# Altium footprint library 定位手表.PcbLib: 35 footprints (part 1 of 3)
Each footprint in its own frame and in the unit in brackets; x right, y up, seen from the top. Pads: shape width x height; smd on the part's side, far side on the other; paste and mask are expansions set on the pad; w line width, h text height; cw(c..) or ccw(c..) is an arc to the next point about the centre after c.
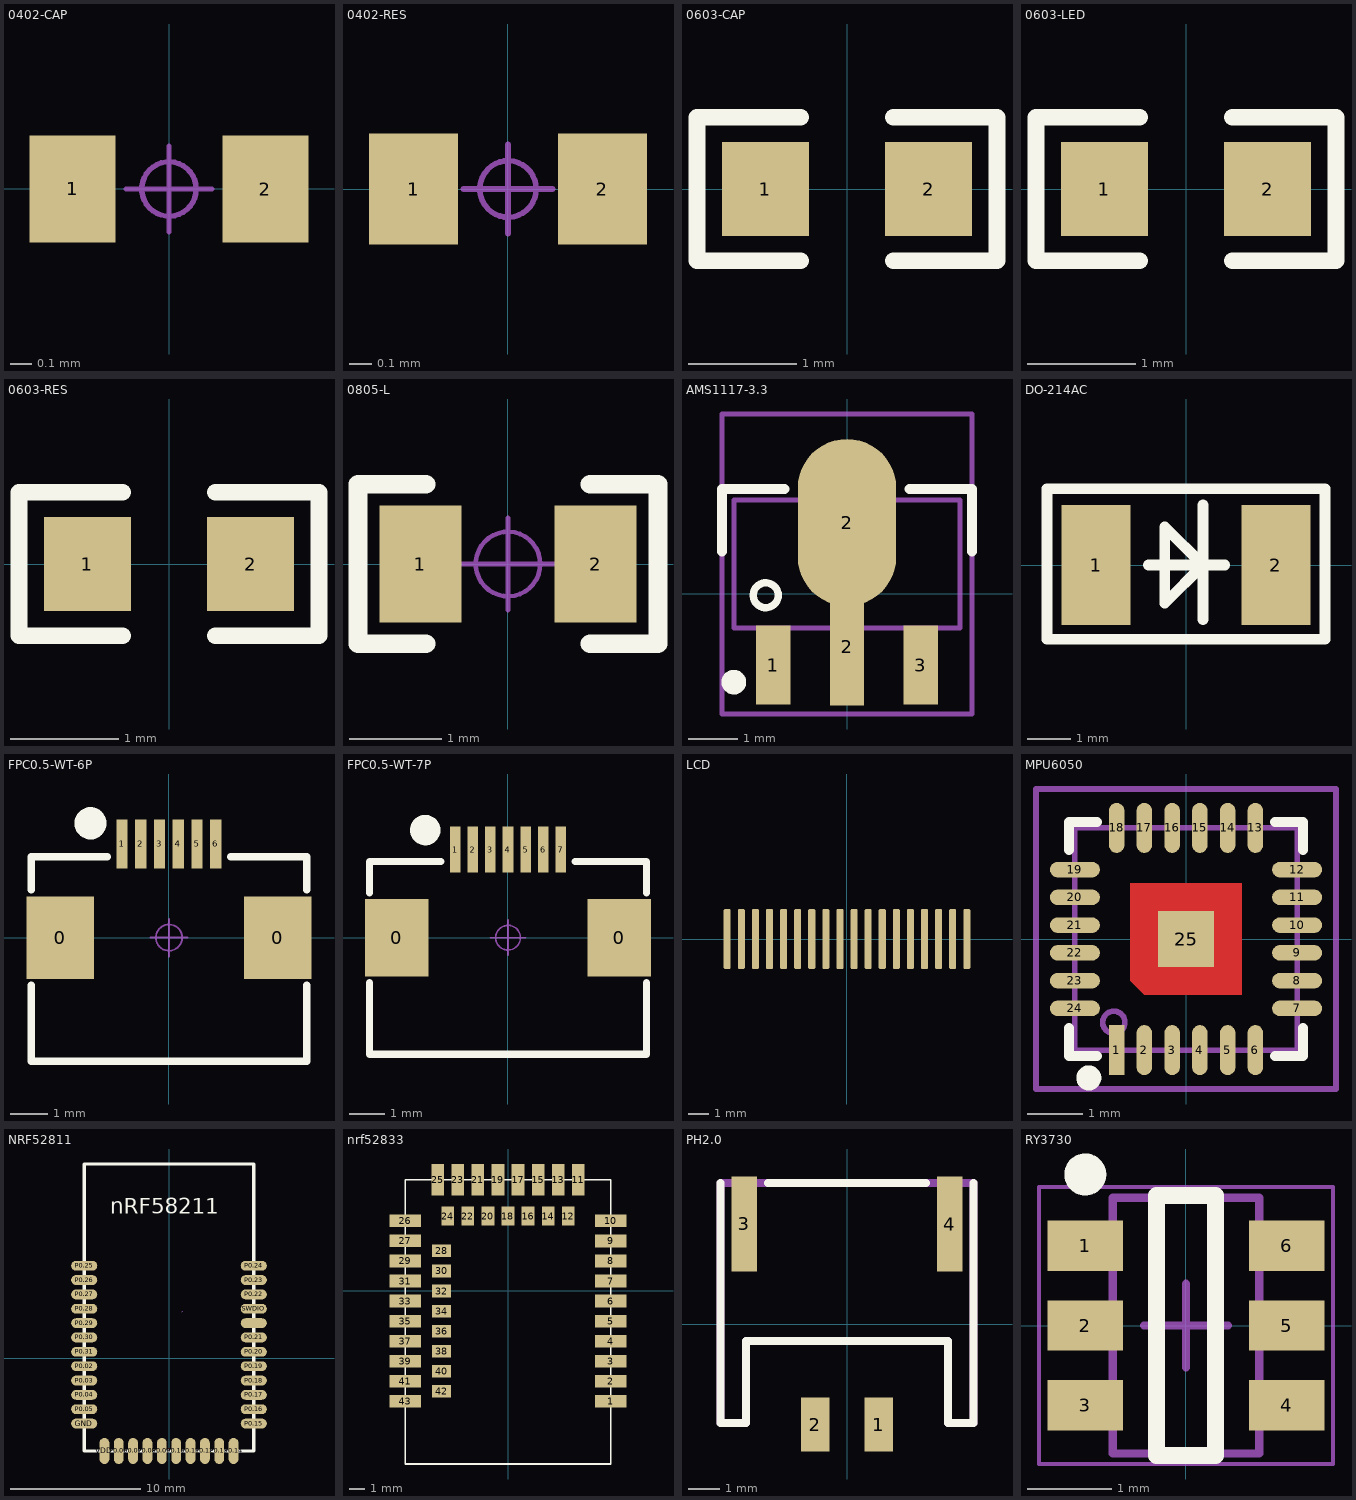
[diagram p0: the footprints below, top view; thin cyan lines are the x and y axes]

## 0402-CAP [mm] "贴片MLCC电容-无丝印             联系卖家 免费查找封装"
pads (2):
  rect 0.4x0.5 smd: 1(-0.45,0) 2(0.45,0)
Mechanical 15:
  circle w0.025: c0,0 r0.127
  lines w0.025: -0.2,0 0.2,0 ; 0,-0.2 0,0.2
3D body "C 0402.STEP": height 0.54, standoff 0.02, extent -0.5,-0.26 0.5,0.26

## 0402-RES [mm] "1/16W贴片电阻-无丝印"
pads (2):
  rect 0.4x0.5 smd: 1(-0.425,0) 2(0.425,0)
Mechanical 15:
  circle w0.025: c0,0 r0.127
  lines w0.025: -0.2,0 0.2,0 ; 0,-0.2 0,0.2
3D body "R0402.STEP": height 0.3, standoff 0, extent -0.5,-0.25 0.5,0.25

## 0603-CAP [mm]
pads (2):
  rect 0.806x0.864 smd: 1(-0.753,0) 2(0.753,0)
Top Overlay:
  lines w0.152: -0.426,-0.661 -1.385,-0.661 -1.385,0.661 -0.426,0.661 ; 0.426,-0.661 1.385,-0.661 1.385,0.661 0.426,0.661
Top Paste:
  region: 1.195,0.45 0.395,0.45 0.345,0.4 0.345,0.172 0.715,0.172 0.715,-0.158 0.345,-0.158 0.345,-0.4 0.395,-0.45 1.195,-0.45 1.245,-0.4 1.245,0.4
  region: -0.355,0.4 -0.355,0.172 -0.735,0.172 -0.735,-0.158 -0.355,-0.158 -0.355,-0.4 -0.405,-0.45 -1.195,-0.45 -1.245,-0.4 -1.245,0.4 -1.195,0.45 -0.405,0.45
3D body "C 0603.STEP": height 0.84, standoff 0.02, extent -0.819,-0.42 0.781,0.4

## 0603-LED [mm]
pads (2):
  rect 0.806x0.864 smd: 1(-0.753,0) 2(0.753,0)
Top Overlay:
  lines w0.152: -0.426,-0.661 -1.385,-0.661 -1.385,0.661 -0.426,0.661 ; 0.426,-0.661 1.385,-0.661 1.385,0.661 0.426,0.661
Top Paste:
  region: -0.355,0.4 -0.355,0.172 -0.735,0.172 -0.735,-0.158 -0.355,-0.158 -0.355,-0.4 -0.405,-0.45 -1.195,-0.45 -1.245,-0.4 -1.245,0.4 -1.195,0.45 -0.405,0.45
  region: 1.195,0.45 0.395,0.45 0.345,0.4 0.345,0.172 0.715,0.172 0.715,-0.158 0.345,-0.158 0.345,-0.4 0.395,-0.45 1.195,-0.45 1.245,-0.4 1.245,0.4
3D body "LED_0603-R.STEP": height 0.47, standoff 0, extent -0.819,-0.411 0.781,0.391

## 0603-RES [mm]
pads (2):
  rect 0.806x0.864 smd: 1(-0.753,0) 2(0.753,0)
Top Overlay:
  lines w0.152: -0.426,-0.661 -1.385,-0.661 -1.385,0.661 -0.426,0.661 ; 0.426,-0.661 1.385,-0.661 1.385,0.661 0.426,0.661
Top Paste:
  region: 1.195,0.45 0.395,0.45 0.345,0.4 0.345,0.172 0.715,0.172 0.715,-0.158 0.345,-0.158 0.345,-0.4 0.395,-0.45 1.195,-0.45 1.245,-0.4 1.245,0.4
  region: -0.355,0.4 -0.355,0.172 -0.735,0.172 -0.735,-0.158 -0.355,-0.158 -0.355,-0.4 -0.405,-0.45 -1.195,-0.45 -1.245,-0.4 -1.245,0.4 -1.195,0.45 -0.405,0.45
3D body "RES0603.STEP": height 0.45, standoff 0, extent -0.819,-0.42 0.781,0.4

## 0805-L [mm] "小功率贴片电感"
height 0.5
pads (2):
  rect 0.889x1.27 smd: 1(-0.95,0) 2(0.95,0)
Top Overlay:
  lines w0.203: -0.889,-0.864 -1.626,-0.864 -1.626,0.864 -0.889,0.864 ; 0.889,-0.864 1.626,-0.864 1.626,0.864 0.889,0.864
Mechanical 15:
  circle w0.05: c0,0 r0.35
  circle w0.05: c0,0 r0.35
  lines w0.05: -0.5,0 0.5,0 -0.5,0 ; 0,-0.5 0,0.5 0,-0.5
3D body "l0805.STEP": height 0.9, standoff 0, extent -1,-0.6 1,0.6

## AMS1117-3.3 [mm]
height 1.6
pads (4):
  rect 0.7x1.6 smd: 1(-1.5,-1.448) 3(1.5,-1.448)
  rect 0.7x2.4 smd: 2(0,-1.071)
  oval 2x3.4 smd: 2(0,1.448)
Top Overlay:
  circle w0.25: c-2.3,-1.794 r0.125
  circle w0.15: c-1.651,-0.029 r0.254
  lines w0.2: -2.54,0.86 -2.54,2.13 -1.27,2.13 ; 1.27,2.13 2.54,2.13 2.54,0.86
Mechanical 13:
  circle w0.1: c-1.651,-0.029 r0.25
  lines w0.1: -2.3,-0.694 2.3,-0.694 2.3,1.906 -2.3,1.906 -2.3,-0.694
Mechanical 15:
  circle w0.05: c0,0.606 r0.35
  lines w0.05: -0.5,0.606 0.5,0.606 ; 0,0.106 0,1.106
  lines w0.1: -2.54,-2.442 -2.54,3.654 2.54,3.654 2.54,-2.442 -2.54,-2.442
3D body "SOT89.STEP": height 1.6, standoff 0.04, extent -2.275,-1.775 2.325,2.525

## DO-214AC [mil]
height 153.54
pads (2):
  rect 63x110 smd: 1(-82.5,0) 2(82.5,0)
Top Overlay:
  lines w10: -34.5,0 35.5,0 ; 15.5,-50 15.5,55 ; -127.5,-68 127.5,-68 127.5,70 -127.5,70 -127.5,-68 ; -19.5,-35 15.5,0 -19.5,35 -19.5,-35
3D body "DO-214AC.STEP": height 94.49, standoff 0, extent -90.05,-53.3 91.05,53

## FPC0.5-WT-6P [mm] "长：7.2mm，宽：5.2mm，高：2mm               黄晶宝石"
pads (8):
  rect 1.8x2.2 smd: 0(-2.9,0) 0(2.9,0)
  rect 0.3x1.3 smd: 1(-1.25,2.497) 2(-0.75,2.497) 3(-0.25,2.497) 4(0.25,2.497) 5(0.75,2.497) 6(1.25,2.497)
Top Overlay:
  circle w0.5: c-2.094,3.048 r0.18
  lines w0.2: -3.675,-1.27 -3.675,-3.302 3.675,-3.302 3.675,-1.27 ; -3.675,1.27 -3.675,2.159 -1.643,2.159 ; 1.643,2.159 3.675,2.159 3.675,1.27
Mechanical 15:
  circle w0.05: c0,0 r0.35
  lines w0.05: -0.5,0 0.5,0 ; 0,-0.5 0,0.5
3D body "FPC0.5_2H-S-W-6P.STEP": height 2, standoff -0.01, extent -3.6,-3.15 3.6,2.85

## FPC0.5-WT-7P [mm] "长：7.7mm，宽：5.2mm，高：2mm"
pads (9):
  rect 1.8x2.2 smd: 0(-3.15,0) 0(3.15,0)
  rect 0.3x1.3 smd: 1(-1.5,2.497) 2(-1,2.497) 3(-0.5,2.497) 4(0,2.497) 5(0.5,2.497) 6(1,2.497) 7(1.5,2.497)
Top Overlay:
  circle w0.5: c-2.344,3.048 r0.18
  lines w0.2: -3.925,-1.27 -3.925,-3.302 3.925,-3.302 3.925,-1.27 ; -3.925,1.27 -3.925,2.159 -1.893,2.159 ; 1.893,2.159 3.925,2.159 3.925,1.27
Mechanical 15:
  circle w0.05: c0,0 r0.35
  lines w0.05: -0.5,0 0.5,0 ; 0,-0.5 0,0.5
3D body "FPC0.5_2H-S-W-7P.STEP": height 2, standoff -0.01, extent -3.85,-3.15 3.85,2.85

## LCD [mm]
pads (18):
  rrect50% 0.35x3 smd: 1(-5.949,-0.001) 2(-5.249,-0.001) 3(-4.549,-0.001) 4(-3.849,-0.001) 5(-3.151,0.001) 6(-2.451,0.001) 7(-1.751,0.001) 8(-1.051,0.001) 9(-0.349,-0.001) 10(0.351,-0.001) 11(1.051,-0.001) 12(1.751,-0.001) 13(2.449,0.001) 14(3.149,0.001) 15(3.849,0.001) 16(4.549,0.001) 17(5.249,0.001) 18(5.949,0.001)

## MPU6050 [mm] "24脚，长x宽x高：4x4x1mm，脚距：0.5mm"
pads (25):
  rect 0.28x0.9 smd: 1(-1.25,-2)
  oval 0.28x0.9 smd: 2(-0.75,-2) 3(-0.25,-2) 4(0.25,-2) 5(0.75,-2) 6(1.25,-2) 13(1.25,2) 14(0.75,2) 15(0.25,2) 16(-0.25,2) 17(-0.75,2) 18(-1.25,2)
  oval 0.9x0.28 smd: 7(2,-1.25) 8(2,-0.75) 9(2,-0.25) 10(2,0.25) 11(2,0.75) 12(2,1.25) 19(-2,1.25) 20(-2,0.75) 21(-2,0.25) 22(-2,-0.25) 23(-2,-0.75) 24(-2,-1.25)
  rect 1x1 smd: 25(0,0)
Top Layer:
  region: -1,1 1,1 1,-1 -0.75,-1 -1,-0.75
Top Overlay:
  circle w0.25: c-1.75,-2.5 r0.1
  lines w0.178: -2.106,-1.6 -2.106,-2.106 -1.6,-2.106 ; -2.106,1.6 -2.106,2.106 -1.6,2.106 ; 1.6,-2.106 2.106,-2.106 2.106,-1.6 ; 1.6,2.106 2.106,2.106 2.106,1.6
Mechanical 13:
  circle w0.1: c-1.3,-1.5 r0.2
  lines w0.1: -2,-2 -2,2 2,2 2,-2 -2,-2
Mechanical 15:
  circle w0.05: c0,0 r0.35
  lines w0.05: -0.5,0 0.5,0 ; 0,-0.5 0,0.5
  lines w0.1: -2.7,-2.7 2.7,-2.7 2.7,2.7 -2.7,2.7 -2.7,-2.7
3D body "QFN24-4x4.STEP": height 0.95, standoff -0.05, extent -2.01,-2.01 2.01,2.01

## NRF52811 [mm]
pads (34):
  oval 2x0.75 smd: GND(-6.5,-5) P0.02(-6.5,-0.6) P0.03(-6.5,-1.7) P0.04(-6.5,-2.8) P0.05(-6.5,-3.9) P0.15(6.5,-5) P0.16(6.5,-3.9) P0.17(6.5,-2.8) P0.18(6.5,-1.7) P0.19(6.5,-0.6) P0.20(6.5,0.5) P0.21(6.5,1.6) P0.22(6.5,4.9) P0.23(6.5,6) P0.24(6.5,7.1) P0.25(-6.5,7.1) P0.26(-6.5,6) P0.27(-6.5,4.9) P0.28(-6.5,3.8) P0.29(-6.5,2.7) P0.30(-6.5,1.6) P0.31(-6.5,0.5) SWDCLK(6.5,2.7) SWDIO(6.5,3.8)
  oval 0.75x2 smd: P0.06(-3.85,-7.1) P0.07(-2.75,-7.1) P0.08(-1.65,-7.1) P0.09(-0.55,-7.1) P0.10(0.55,-7.1) P0.11(1.65,-7.1) P0.12(2.75,-7.1) P0.13(3.85,-7.1) P0.14(4.95,-7.1) VDD(-4.95,-7.1)
Top Overlay:
  lines w0.254: -6.5,-7.1 -6.5,14.9 6.5,14.9 6.5,-7.1 -6.5,-7.1
  text "nRF58211" at -4.506,11.074 h1.2
Mechanical 15:
  lines w0.003: 0.991,3.565 1.041,3.616
3D body "nrf52811.step": height 1.61, standoff 0, extent -6.452,-7.233 6.556,14.776

## nrf52833 [mm]
pads (43):
  rect 2x0.8 smd: 1(6.5,-7.015) 2(6.5,-5.745) 3(6.5,-4.475) 4(6.5,-3.205) 5(6.5,-1.935) 6(6.5,-0.665) 7(6.5,0.605) 8(6.5,1.875) 9(6.5,3.142) 10(6.5,4.415) 26(-6.5,4.415) 27(-6.5,3.145) 29(-6.5,1.875) 31(-6.5,0.605) 33(-6.5,-0.665) 35(-6.5,-1.935) 37(-6.5,-3.205) 39(-6.5,-4.475) 41(-6.5,-5.742) 43(-6.5,-7.015)
  rect 0.8x2 smd: 11(4.445,7.015) 13(3.175,7.015) 15(1.905,7.015) 17(0.635,7.015) 19(-0.635,7.015) 21(-1.905,7.015) 23(-3.175,7.015) 25(-4.445,7.015)
  rect 0.8x1.2 smd: 12(3.81,4.715) 14(2.54,4.715) 16(1.27,4.715) 18(0,4.715) 20(-1.27,4.715) 22(-2.54,4.715) 24(-3.81,4.715)
  rect 1.2x0.8 smd: 28(-4.2,2.51) 30(-4.2,1.24) 32(-4.2,-0.03) 34(-4.2,-1.3) 36(-4.2,-2.57) 38(-4.2,-3.84) 40(-4.2,-5.11) 42(-4.2,-6.375)
Top Overlay:
  lines w0.1: -6.5,-10.985 -6.5,7.015 6.5,7.015 6.5,-10.985 -6.5,-10.985

## PH2.0 [mm]
pads (4):
  rect 0.9x1.7 smd: 1(1,-3.175) 2(-1,-3.175)
  rect 0.8x3 smd: 3(-3.25,3.175) 4(3.25,3.175)
Top Overlay:
  lines w0.254: -4,-3.125 -3.2,-3.125 -3.2,-0.529 3.201,-0.529 3.2,-3.125 4,-3.125 ; -4,-3.125 -4,4.475 ; -2.5,4.475 2.5,4.475 ; 4,-3.125 4,4.475
Mechanical 15:
  lines w0.254: -3.2,-0.529 -3.2,-3.125 -4,-3.125 -4,4.475 4,4.475 4,-3.125 3.2,-3.125 3.2,-0.529 ; -3.2,-0.529 3.201,-0.529
3D body "PH2.0_SMD-W-2P.STEP": height 5.55, standoff 0.05, extent -3.943,-4.039 4.057,4.561

## RY3730 [mm] "SOT-23, 6-Leads, Body 2.90x1.60mm, Pitch 0.95mm, IPC High Density"
height 1.45
pads (6):
  rect 0.9x0.6 smd: 1(-1.2,0.95) 2(-1.2,0) 3(-1.2,-0.95) 4(1.2,-0.95) 5(1.2,0) 6(1.2,0.95)
Top Overlay:
  circle w0.25: c-1.2,1.8 r0.125
  lines w0.2: -0.35,-1.55 0.35,-1.55 0.35,1.55 -0.35,1.55 -0.35,-1.55
Mechanical 13:
  lines w0.1: -0.875,-1.525 -0.875,1.525 0.875,1.525 0.875,-1.525 -0.875,-1.525
Mechanical 15:
  lines w0.05: -1.75,-1.65 -1.75,1.65 1.75,1.65 1.75,-1.65 -1.75,-1.65
  lines w0.1: -0.5,0 0.5,0 ; 0,-0.5 0,0.5
3D body "SOT23-6.STEP": height 1.15, standoff -0.03, extent -1.403,-1.5 1.404,1.5